# Altium footprint library TI Power Management DC-DC Controller (External Switch).PcbLib: 72 footprints (part 5 of 5)
Each footprint in its own frame and in the unit in brackets; x right, y up, seen from the top. Pads: shape width x height; smd on the part's side, far side on the other; paste and mask are expansions set on the pad; w line width, h text height; cw(c..) or ccw(c..) is an arc to the next point about the centre after c.
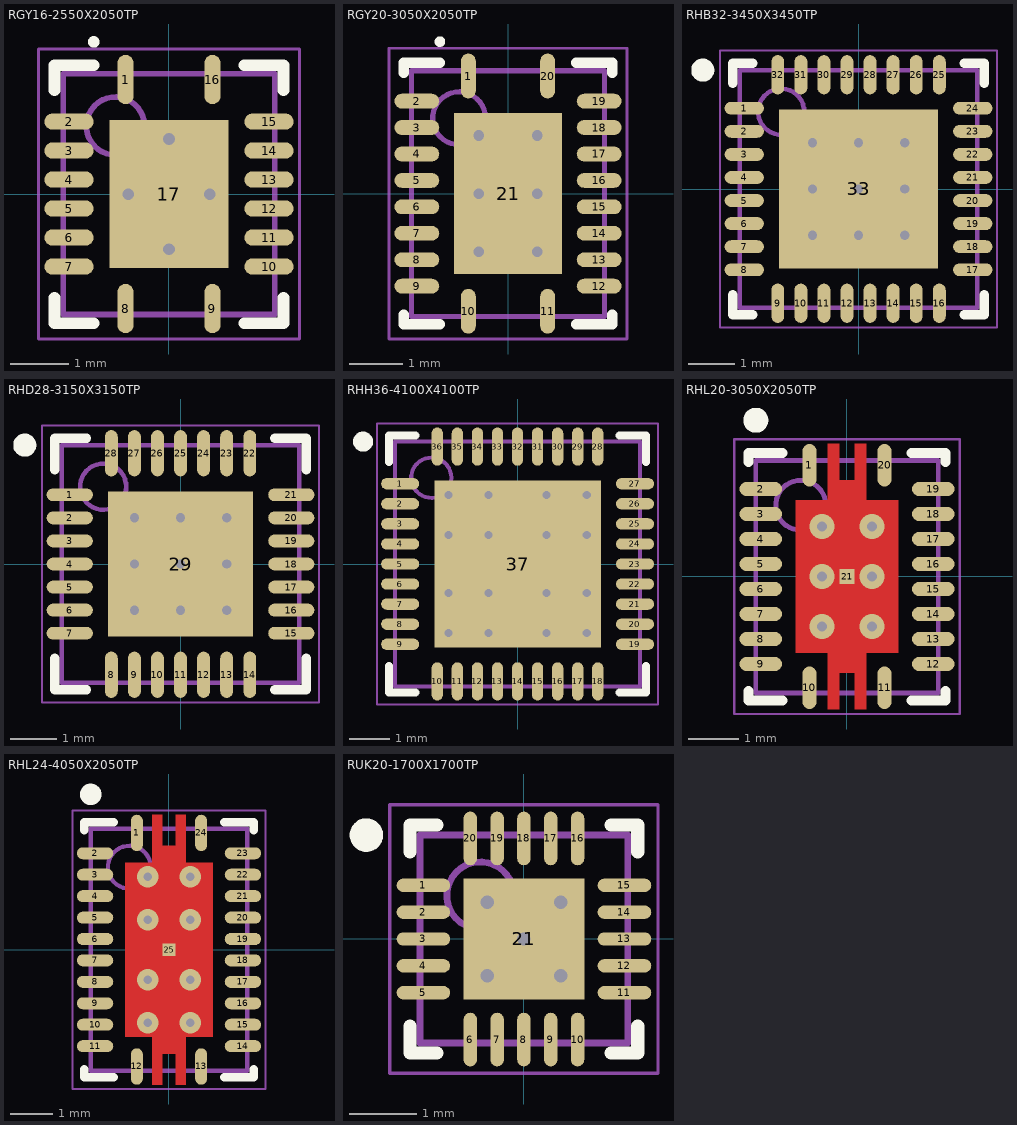
[diagram p4: the footprints below, top view; thin cyan lines are the x and y axes]

## RGY16-2550X2050TP [mm] "QFN, 16-Leads, Body 4x3.5mm, Pitch 0.5mm, Thermal Pad 2.55x2.05mm, TI Recommended"
height 1
pads (17):
  oval 0.28x0.85 smd paste-0.025 mask+0.07: 1(-0.75,1.975) 8(-0.75,-1.975) 9(0.75,-1.975) 16(0.75,1.975)
  oval 0.85x0.28 smd paste-0.025 mask+0.07: 2(-1.725,1.25) 3(-1.725,0.75) 4(-1.725,0.25) 5(-1.725,-0.25) 6(-1.725,-0.75) 7(-1.725,-1.25) 10(1.725,-1.25) 11(1.725,-0.75) 12(1.725,-0.25) 13(1.725,0.25) 14(1.725,0.75) 15(1.725,1.25)
  rect 2.05x2.55 smd paste-1.025 mask+0.07: 17(0,0)
via 0,-0.95 diameter 0.5 hole 0.2
via 0.7,0 diameter 0.5 hole 0.2
via -0.7,0 diameter 0.5 hole 0.2
via 0,0.95 diameter 0.5 hole 0.2
Top Overlay:
  circle w0.1: c-1.297,2.625 r0.05
  lines w0.2: -1.975,-1.79 -1.975,-2.225 -1.3,-2.225 ; -1.975,1.79 -1.975,2.225 -1.3,2.225 ; 1.3,-2.225 1.975,-2.225 1.975,-1.79 ; 1.3,2.225 1.975,2.225 1.975,1.79
Top Paste:
  region: 0.15,1.22 0.15,0.15 0.97,0.15 0.97,1.22
  region: -0.15,-1.22 -0.15,-0.15 -0.97,-0.15 -0.97,-1.22
  region: 0.97,-1.22 0.97,-0.15 0.15,-0.15 0.15,-1.22
  region: -0.97,1.22 -0.97,0.15 -0.15,0.15 -0.15,1.22
Mechanical 13:
  circle w0.1: c-0.925,1.175 r0.5
  lines w0.1: -1.825,-2.075 -1.825,2.075 1.825,2.075 1.825,-2.075 -1.825,-2.075
Mechanical 15:
  lines w0.05: -2.25,-2.5 -2.25,2.5 2.25,2.5 2.25,-2.5 -2.25,-2.5
  lines w0.1: -0.5,0 0.5,0 ; 0,-0.5 0,0.5
3D body "QFN16-RGY16.STEP": height 1, standoff 0, extent -1.821,-2.067 1.829,2.083

## RGY20-3050X2050TP [mm] "QFN, 20-Leads, Body 4.5x3.5mm, Pitch 0.5mm, Thermal Pad 3.05x2.05mm, TI Recommended"
height 1
pads (21):
  oval 0.28x0.85 smd paste-0.025 mask+0.07: 1(-0.75,2.225) 10(-0.75,-2.225) 11(0.75,-2.225) 20(0.75,2.225)
  oval 0.85x0.28 smd paste-0.025 mask+0.07: 2(-1.725,1.75) 3(-1.725,1.25) 4(-1.725,0.75) 5(-1.725,0.25) 6(-1.725,-0.25) 7(-1.725,-0.75) 8(-1.725,-1.25) 9(-1.725,-1.75) 12(1.725,-1.75) 13(1.725,-1.25) 14(1.725,-0.75) 15(1.725,-0.25) 16(1.725,0.25) 17(1.725,0.75) 18(1.725,1.25) 19(1.725,1.75)
  rect 2.05x3.05 smd paste-1.025 mask+0.07: 21(0,0)
via -0.55,1.1 diameter 0.5 hole 0.2
via -0.55,0 diameter 0.5 hole 0.2
via -0.55,-1.1 diameter 0.5 hole 0.2
via 0.55,1.1 diameter 0.5 hole 0.2
via 0.55,0 diameter 0.5 hole 0.2
via 0.55,-1.1 diameter 0.5 hole 0.2
Top Overlay:
  circle w0.1: c-1.288,2.875 r0.05
  lines w0.2: -1.975,-2.29 -1.975,-2.475 -1.29,-2.475 ; -1.975,2.29 -1.975,2.475 -1.29,2.475 ; 1.29,-2.475 1.975,-2.475 1.975,-2.29 ; 1.29,2.475 1.975,2.475 1.975,2.29
Top Paste:
  region: -0.15,-1.47 -0.15,-0.15 -0.97,-0.15 -0.97,-1.47
  region: 0.97,-1.47 0.97,-0.15 0.15,-0.15 0.15,-1.47
  region: 0.15,1.47 0.15,0.15 0.97,0.15 0.97,1.47
  region: -0.97,1.47 -0.97,0.15 -0.15,0.15 -0.15,1.47
Mechanical 13:
  circle w0.1: c-0.925,1.425 r0.5
  lines w0.1: -1.825,-2.325 1.825,-2.325 1.825,2.325 -1.825,2.325 -1.825,-2.325
Mechanical 15:
  lines w0.05: -2.25,-2.75 2.25,-2.75 2.25,2.75 -2.25,2.75 -2.25,-2.75
  lines w0.1: -0.5,0 0.5,0 ; 0,-0.5 0,0.5
3D body "QFN20-RGY20.step": height 1.01, standoff 0.01, extent -1.81,-2.31 1.81,2.31

## RHB32-3450X3450TP [mm] "QFN, 32-Leads, Body 5x5mm, Pitch 0.5mm, Thermal Pad 3.45x3.45mm, TI Recommended"
height 1
pads (33):
  oval 0.85x0.28 smd paste-0.025 mask+0.07: 1(-2.475,1.75) 2(-2.475,1.25) 3(-2.475,0.75) 4(-2.475,0.25) 5(-2.475,-0.25) 6(-2.475,-0.75) 7(-2.475,-1.25) 8(-2.475,-1.75) 17(2.475,-1.75) 18(2.475,-1.25) 19(2.475,-0.75) 20(2.475,-0.25) 21(2.475,0.25) 22(2.475,0.75) 23(2.475,1.25) 24(2.475,1.75)
  oval 0.28x0.85 smd paste-0.025 mask+0.07: 9(-1.75,-2.475) 10(-1.25,-2.475) 11(-0.75,-2.475) 12(-0.25,-2.475) 13(0.25,-2.475) 14(0.75,-2.475) 15(1.25,-2.475) 16(1.75,-2.475) 25(1.75,2.475) 26(1.25,2.475) 27(0.75,2.475) 28(0.25,2.475) 29(-0.25,2.475) 30(-0.75,2.475) 31(-1.25,2.475) 32(-1.75,2.475)
  rect 3.45x3.45 smd paste-1.725 mask+0.07: 33(0,0)
via -1,1 diameter 0.5 hole 0.2
via 0,1 diameter 0.5 hole 0.2
via 1,1 diameter 0.5 hole 0.2
via -1,0 diameter 0.5 hole 0.2
via 0,0 diameter 0.5 hole 0.2
via 1,0 diameter 0.5 hole 0.2
via -1,-1 diameter 0.5 hole 0.2
via 0,-1 diameter 0.5 hole 0.2
via 1,-1 diameter 0.5 hole 0.2
Top Overlay:
  circle w0.25: c-3.375,2.575 r0.125
  lines w0.2: -2.725,-2.29 -2.725,-2.725 -2.29,-2.725 ; -2.725,2.29 -2.725,2.725 -2.29,2.725 ; 2.29,-2.725 2.725,-2.725 2.725,-2.29 ; 2.29,2.725 2.725,2.725 2.725,2.29
Top Paste:
  region: -0.15,1.6 -1.6,1.6 -1.6,0.15 -0.15,0.15
  rectangle: 0.15,0.15 1.6,1.6
  rectangle: 0.15,-1.6 1.6,-0.15
  region: -0.15,-0.15 -1.6,-0.15 -1.6,-1.6 -0.15,-1.6
Mechanical 13:
  circle w0.1: c-1.675,1.675 r0.5
  lines w0.1: -2.575,-2.575 -2.575,2.575 2.575,2.575 2.575,-2.575 -2.575,-2.575
Mechanical 15:
  lines w0.05: -3,-3 -3,3 3,3 3,-3 -3,-3
  lines w0.1: -0.5,0 0.5,0 ; 0,-0.5 0,0.5
3D body "QFN32-5x5.step": height 0.8, standoff 0, extent -2.51,-2.51 2.51,2.51

## RHD28-3150X3150TP [mm] "QFN, 28-Leads, Body 5x5mm, Pitch 0.5mm, Thermal Pad 3.15x3.15mm, TI Recommended"
height 1
pads (29):
  oval 1x0.28 smd paste-0.025 mask+0.05: 1(-2.4,1.5) 2(-2.4,1) 3(-2.4,0.5) 4(-2.4,0) 5(-2.4,-0.5) 6(-2.4,-1) 7(-2.4,-1.5) 15(2.4,-1.5) 16(2.4,-1) 17(2.4,-0.5) 18(2.4,0) 19(2.4,0.5) 20(2.4,1) 21(2.4,1.5)
  oval 0.28x1 smd paste-0.025 mask+0.05: 8(-1.5,-2.4) 9(-1,-2.4) 10(-0.5,-2.4) 11(0,-2.4) 12(0.5,-2.4) 13(1,-2.4) 14(1.5,-2.4) 22(1.5,2.4) 23(1,2.4) 24(0.5,2.4) 25(0,2.4) 26(-0.5,2.4) 27(-1,2.4) 28(-1.5,2.4)
  rect 3.15x3.15 smd paste-1.575 mask+0.05: 29(0,0)
via 1,-1 diameter 0.5 hole 0.2
via 0,-1 diameter 0.5 hole 0.2
via -1,-1 diameter 0.5 hole 0.2
via 1,0 diameter 0.5 hole 0.2
via 0,0 diameter 0.5 hole 0.2
via -1,0 diameter 0.5 hole 0.2
via 1,1 diameter 0.5 hole 0.2
via 0,1 diameter 0.5 hole 0.2
via -1,1 diameter 0.5 hole 0.2
Top Overlay:
  circle w0.25: c-3.375,2.575 r0.125
  lines w0.2: -2.725,-2.04 -2.725,-2.725 -2.04,-2.725 ; -2.725,2.04 -2.725,2.725 -2.04,2.725 ; 2.04,-2.725 2.725,-2.725 2.725,-2.04 ; 2.04,2.725 2.725,2.725 2.725,2.04
Top Paste:
  rectangle: -1.45,0.15 -0.15,1.45
  region: 1.45,1.45 0.15,1.45 0.15,0.15 1.45,0.15
  region: 1.45,-0.15 0.15,-0.15 0.15,-1.45 1.45,-1.45
  rectangle: -1.45,-1.45 -0.15,-0.15
Mechanical 13:
  circle w0.1: c-1.675,1.675 r0.5
  lines w0.1: -2.575,-2.575 2.575,-2.575 2.575,2.575 -2.575,2.575 -2.575,-2.575
Mechanical 15:
  lines w0.05: -3,-3 3,-3 3,3 -3,3 -3,-3
  lines w0.1: -0.5,0 0.5,0 ; 0,-0.5 0,0.5
3D body "QFN28-0_5.STEP": height 1, standoff 0, extent -2.5,-2.5 2.5,2.5

## RHH36-4100X4100TP [mm] "QFN, 36-Leads, Body 6x6mm, Pitch 0.5mm, Thermal Pad 4.15x4.15mm, TI Recommended"
height 1
pads (37):
  oval 0.95x0.28 smd paste-0.025 mask+0.07: 1(-2.925,2) 2(-2.925,1.5) 3(-2.925,1) 4(-2.925,0.5) 5(-2.925,0) 6(-2.925,-0.5) 7(-2.925,-1) 8(-2.925,-1.5) 9(-2.925,-2) 19(2.925,-2) 20(2.925,-1.5) 21(2.925,-1) 22(2.925,-0.5) 23(2.925,0) 24(2.925,0.5) 25(2.925,1) 26(2.925,1.5) 27(2.925,2)
  oval 0.28x0.95 smd paste-0.025 mask+0.07: 10(-2,-2.925) 11(-1.5,-2.925) 12(-1,-2.925) 13(-0.5,-2.925) 14(0,-2.925) 15(0.5,-2.925) 16(1,-2.925) 17(1.5,-2.925) 18(2,-2.925) 28(2,2.925) 29(1.5,2.925) 30(1,2.925) 31(0.5,2.925) 32(0,2.925) 33(-0.5,2.925) 34(-1,2.925) 35(-1.5,2.925) 36(-2,2.925)
  rect 4.15x4.15 smd paste-2.075 mask+0.07: 37(0,0)
via 1.725,-1.725 diameter 0.5 hole 0.2
via 0.725,-1.725 diameter 0.5 hole 0.2
via -0.725,-1.725 diameter 0.5 hole 0.2
via -1.725,-1.725 diameter 0.5 hole 0.2
via 1.725,-0.725 diameter 0.5 hole 0.2
via 0.725,-0.725 diameter 0.5 hole 0.2
via -0.725,-0.725 diameter 0.5 hole 0.2
via -1.725,-0.725 diameter 0.5 hole 0.2
via 1.725,0.725 diameter 0.5 hole 0.2
via 0.725,0.725 diameter 0.5 hole 0.2
via -0.725,0.725 diameter 0.5 hole 0.2
via -1.725,0.725 diameter 0.5 hole 0.2
via 1.725,1.725 diameter 0.5 hole 0.2
via 0.725,1.725 diameter 0.5 hole 0.2
via -0.725,1.725 diameter 0.5 hole 0.2
via -1.725,1.725 diameter 0.5 hole 0.2
Top Overlay:
  circle w0.25: c-3.85,3.05 r0.125
  lines w0.2: -3.2,-2.54 -3.2,-3.2 -2.54,-3.2 ; -3.2,2.54 -3.2,3.2 -2.54,3.2 ; 2.54,-3.2 3.2,-3.2 3.2,-2.54 ; 2.54,3.2 3.2,3.2 3.2,2.54
Top Paste:
  region: -0.875,-2.025 -0.875,-0.875 -2.025,-0.875 -2.025,-2.025
  region: 0.875,-0.875 0.875,-2.025 2.025,-2.025 2.025,-0.875
  region: -2.025,2.025 -2.025,0.875 -0.875,0.875 -0.875,2.025
  region: 0.875,2.025 0.875,0.875 2.025,0.875 2.025,2.025
  region: 0.875,0.575 0.875,-0.575 2.025,-0.575 2.025,0.575
  region: 0.575,-0.875 -0.575,-0.875 -0.575,-2.025 0.575,-2.025
  region: -0.875,-0.575 -0.875,0.575 -2.025,0.575 -2.025,-0.575
  rectangle: -0.575,0.875 0.575,2.025
  rectangle: -0.575,-0.575 0.575,0.575
Mechanical 13:
  circle w0.1: c-2.15,2.15 r0.5
  lines w0.1: -3.05,-3.05 3.05,-3.05 3.05,3.05 -3.05,3.05 -3.05,-3.05
Mechanical 15:
  lines w0.05: -3.5,-3.5 3.5,-3.5 3.5,3.5 -3.5,3.5 -3.5,-3.5
  lines w0.1: -0.5,0 0.5,0 ; 0,-0.5 0,0.5
3D body "QFN36_6X6.STEP": height 0.8, standoff 0, extent -3.06,-3.06 3.06,3.06

## RHL20-3050X2050TP [mm] "QFN, 20-Leads, Body 4.5x3.5mm, Pitch 0.5mm, Thermal Pad 3.05x2.05mm, TI Recommended"
height 1
pads (21):
  oval 0.28x0.85 smd paste-0.025 mask+0.07: 1(-0.75,2.225) 10(-0.75,-2.225) 11(0.75,-2.225) 20(0.75,2.225)
  oval 0.85x0.28 smd paste-0.025 mask+0.07: 2(-1.725,1.75) 3(-1.725,1.25) 4(-1.725,0.75) 5(-1.725,0.25) 6(-1.725,-0.25) 7(-1.725,-0.75) 8(-1.725,-1.25) 9(-1.725,-1.75) 12(1.725,-1.75) 13(1.725,-1.25) 14(1.725,-0.75) 15(1.725,-0.25) 16(1.725,0.25) 17(1.725,0.75) 18(1.725,1.25) 19(1.725,1.75)
  rect 0.3x0.3 smd paste-0.15 mask+0: 21(0,0)
via 0.5,-1 diameter 0.5 hole 0.2
via 0.5,0 diameter 0.5 hole 0.2
via 0.5,1 diameter 0.5 hole 0.2
via -0.5,-1 diameter 0.5 hole 0.2
via -0.5,0 diameter 0.5 hole 0.2
via -0.5,1 diameter 0.5 hole 0.2
Top Layer:
  region: 0.16,2.65 0.16,1.925 -0.16,1.925 -0.16,2.65 -0.39,2.65 -0.39,1.525 -1.025,1.525 -1.025,-1.525 -0.39,-1.525 -0.39,-2.65 -0.16,-2.65 -0.16,-1.925 0.16,-1.925 0.16,-2.65 0.39,-2.65 0.39,-1.525 1.025,-1.525 1.025,1.525 0.39,1.525 0.39,2.65
Top Overlay:
  circle w0.25: c-1.825,3.125 r0.125
  lines w0.2: -1.975,-2.29 -1.975,-2.475 -1.29,-2.475 ; -1.975,2.29 -1.975,2.475 -1.29,2.475 ; 1.29,-2.475 1.975,-2.475 1.975,-2.29 ; 1.29,2.475 1.975,2.475 1.975,2.29
Top Paste:
  region: 0.15,1.47 0.15,0.15 0.97,0.15 0.97,1.47
  region: 0.97,-1.47 0.97,-0.15 0.15,-0.15 0.15,-1.47
  region: -0.15,-1.47 -0.15,-0.15 -0.97,-0.15 -0.97,-1.47
  region: -0.97,1.47 -0.97,0.15 -0.15,0.15 -0.15,1.47
  region: 0.39,-2.625 0.39,-1.725 0.16,-1.725 0.16,-2.625
  region: 0.16,2.625 0.16,1.725 0.39,1.725 0.39,2.625
  region: -0.16,-2.625 -0.16,-1.725 -0.39,-1.725 -0.39,-2.625
  region: -0.39,2.625 -0.39,1.725 -0.16,1.725 -0.16,2.625
Mechanical 13:
  circle w0.1: c-0.925,1.425 r0.5
  lines w0.1: -1.825,-2.325 -1.825,2.325 1.825,2.325 1.825,-2.325 -1.825,-2.325
Mechanical 15:
  lines w0.05: -2.25,-2.75 -2.25,2.75 2.25,2.75 2.25,-2.75 -2.25,-2.75
  lines w0.1: -0.5,0 0.5,0 ; 0,-0.5 0,0.5
3D body "QFN20-RGY20.step": height 0.95, standoff -0.05, extent -1.81,-2.31 1.81,2.31

## RHL24-4050X2050TP [mm] "QFN, 24-Leads, Body 5.5x3.5mm, Pitch 0.5mm, Thermal Pad 4.05x2.05mm, TI Recommended"
height 1
pads (25):
  oval 0.28x0.85 smd paste-0.025 mask+0.07: 1(-0.75,2.725) 12(-0.75,-2.725) 13(0.75,-2.725) 24(0.75,2.725)
  oval 0.85x0.28 smd paste-0.025 mask+0.07: 2(-1.725,2.25) 3(-1.725,1.75) 4(-1.725,1.25) 5(-1.725,0.75) 6(-1.725,0.25) 7(-1.725,-0.25) 8(-1.725,-0.75) 9(-1.725,-1.25) 10(-1.725,-1.75) 11(-1.725,-2.25) 14(1.725,-2.25) 15(1.725,-1.75) 16(1.725,-1.25) 17(1.725,-0.75) 18(1.725,-0.25) 19(1.725,0.25) 20(1.725,0.75) 21(1.725,1.25) 22(1.725,1.75) 23(1.725,2.25)
  rect 0.3x0.3 smd paste-0.15 mask+0: 25(0,0)
via -0.5,1.7 diameter 0.5 hole 0.2
via -0.5,0.7 diameter 0.5 hole 0.2
via -0.5,-0.7 diameter 0.5 hole 0.2
via -0.5,-1.7 diameter 0.5 hole 0.2
via 0.5,1.7 diameter 0.5 hole 0.2
via 0.5,0.7 diameter 0.5 hole 0.2
via 0.5,-0.7 diameter 0.5 hole 0.2
via 0.5,-1.7 diameter 0.5 hole 0.2
Top Layer:
  region: 0.39,3.15 0.16,3.15 0.16,2.425 -0.16,2.425 -0.16,3.15 -0.39,3.15 -0.39,2.025 -1.025,2.025 -1.025,-2.025 -0.39,-2.025 -0.39,-3.15 -0.16,-3.15 -0.16,-2.425 0.16,-2.425 0.16,-3.15 0.39,-3.15 0.39,-2.025 1.025,-2.025 1.025,2.025 0.39,2.025
Top Overlay:
  circle w0.25: c-1.825,3.625 r0.125
  lines w0.2: -1.975,-2.79 -1.975,-2.975 -1.29,-2.975 ; -1.975,2.79 -1.975,2.975 -1.29,2.975 ; 1.29,-2.975 1.975,-2.975 1.975,-2.79 ; 1.29,2.975 1.975,2.975 1.975,2.79
Top Paste:
  region: 0.15,-0.85 0.15,-1.95 0.97,-1.95 0.97,-0.85
  region: -0.15,-1.95 -0.15,-0.85 -0.97,-0.85 -0.97,-1.95
  region: -0.97,1.95 -0.97,0.85 -0.15,0.85 -0.15,1.95
  region: 0.97,0.85 0.97,1.95 0.15,1.95 0.15,0.85
  region: 0.97,-0.55 0.97,0.55 0.15,0.55 0.15,-0.55
  region: -0.97,0.55 -0.97,-0.55 -0.15,-0.55 -0.15,0.55
  region: 0.39,-3.15 0.39,-2.25 0.16,-2.25 0.16,-3.15
  region: 0.16,3.15 0.16,2.25 0.39,2.25 0.39,3.15
  region: -0.39,3.15 -0.39,2.25 -0.16,2.25 -0.16,3.15
  region: -0.16,-3.15 -0.16,-2.25 -0.39,-2.25 -0.39,-3.15
Mechanical 13:
  circle w0.1: c-0.925,1.925 r0.5
  lines w0.1: -1.825,-2.825 1.825,-2.825 1.825,2.825 -1.825,2.825 -1.825,-2.825
Mechanical 15:
  lines w0.05: -2.25,-3.25 2.25,-3.25 2.25,3.25 -2.25,3.25 -2.25,-3.25
  lines w0.1: -0.5,0 0.5,0 ; 0,-0.5 0,0.5
3D body: height 1, standoff 0, extent -1.825,-2.825 1.825,2.825

## RUK20-1700X1700TP [mm] "QFN, 20-Leads, Body 3x3mm, Pitch 0.4mm, Thermal Pad 1.8x1.8mm, TI Recommended"
height 0.8
pads (21):
  oval 0.8x0.2 smd paste-0.1 mask+0.05: 1(-1.5,0.8) 2(-1.5,0.4) 3(-1.5,0) 4(-1.5,-0.4) 5(-1.5,-0.8) 11(1.5,-0.8) 12(1.5,-0.4) 13(1.5,0) 14(1.5,0.4) 15(1.5,0.8)
  oval 0.2x0.8 smd paste-0.1 mask+0.05: 6(-0.8,-1.5) 7(-0.4,-1.5) 8(0,-1.5) 9(0.4,-1.5) 10(0.8,-1.5) 16(0.8,1.5) 17(0.4,1.5) 18(0,1.5) 19(-0.4,1.5) 20(-0.8,1.5)
  rect 1.8x1.8 smd paste-0.9 mask+0.05: 21(0,0)
via -0.55,0.55 diameter 0.5 hole 0.2
via 0.55,0.55 diameter 0.5 hole 0.2
via 0,0 diameter 0.5 hole 0.2
via -0.55,-0.55 diameter 0.5 hole 0.2
via 0.55,-0.55 diameter 0.5 hole 0.2
Top Overlay:
  circle w0.25: c-2.35,1.55 r0.125
  lines w0.2: -1.7,-1.3 -1.7,-1.7 -1.3,-1.7 ; -1.7,1.3 -1.7,1.7 -1.3,1.7 ; 1.3,-1.7 1.7,-1.7 1.7,-1.3 ; 1.3,1.7 1.7,1.7 1.7,1.3
Top Paste:
  rectangle: 0.15,0.15 0.88,0.88
  region: -0.15,0.88 -0.88,0.88 -0.88,0.15 -0.15,0.15
  region: -0.15,-0.15 -0.88,-0.15 -0.88,-0.88 -0.15,-0.88
  rectangle: 0.15,-0.88 0.88,-0.15
  lines w0.2: -1.775,-0.8 -1.225,-0.8 ; -1.775,-0.4 -1.225,-0.4 ; -1.775,0 -1.225,0 ; -1.775,0.4 -1.225,0.4 ; -1.775,0.8 -1.225,0.8 ; -0.8,-1.775 -0.8,-1.225 ; -0.8,1.225 -0.8,1.775 ; -0.4,-1.775 -0.4,-1.225 ; -0.4,1.225 -0.4,1.775 ; 0,-1.775 0,-1.225 ; 0,1.225 0,1.775 ; 0.4,-1.775 0.4,-1.225 ; 0.4,1.225 0.4,1.775 ; 0.8,-1.775 0.8,-1.225 ; 0.8,1.225 0.8,1.775 ; 1.225,-0.8 1.775,-0.8 ; 1.225,-0.4 1.775,-0.4 ; 1.225,0 1.775,0 ; 1.225,0.4 1.775,0.4 ; 1.225,0.8 1.775,0.8
Mechanical 13:
  circle w0.1: c-0.65,0.65 r0.5
  lines w0.1: -1.55,-1.55 -1.55,1.55 1.55,1.55 1.55,-1.55 -1.55,-1.55
Mechanical 15:
  lines w0.05: -2,-2 -2,2 2,2 2,-2 -2,-2
  lines w0.1: -0.5,0 0.5,0 ; 0,-0.5 0,0.5
3D body "QFN20_3X3.step": height 0.75, standoff 0, extent -1.51,-1.51 1.51,1.51